# Altium footprint library Team Starcraft.PcbLib: 62 footprints (part 1 of 4)
Each footprint in its own frame and in the unit in brackets; x right, y up, seen from the top. Pads: shape width x height; smd on the part's side, far side on the other; paste and mask are expansions set on the pad; w line width, h text height; cw(c..) or ccw(c..) is an arc to the next point about the centre after c.
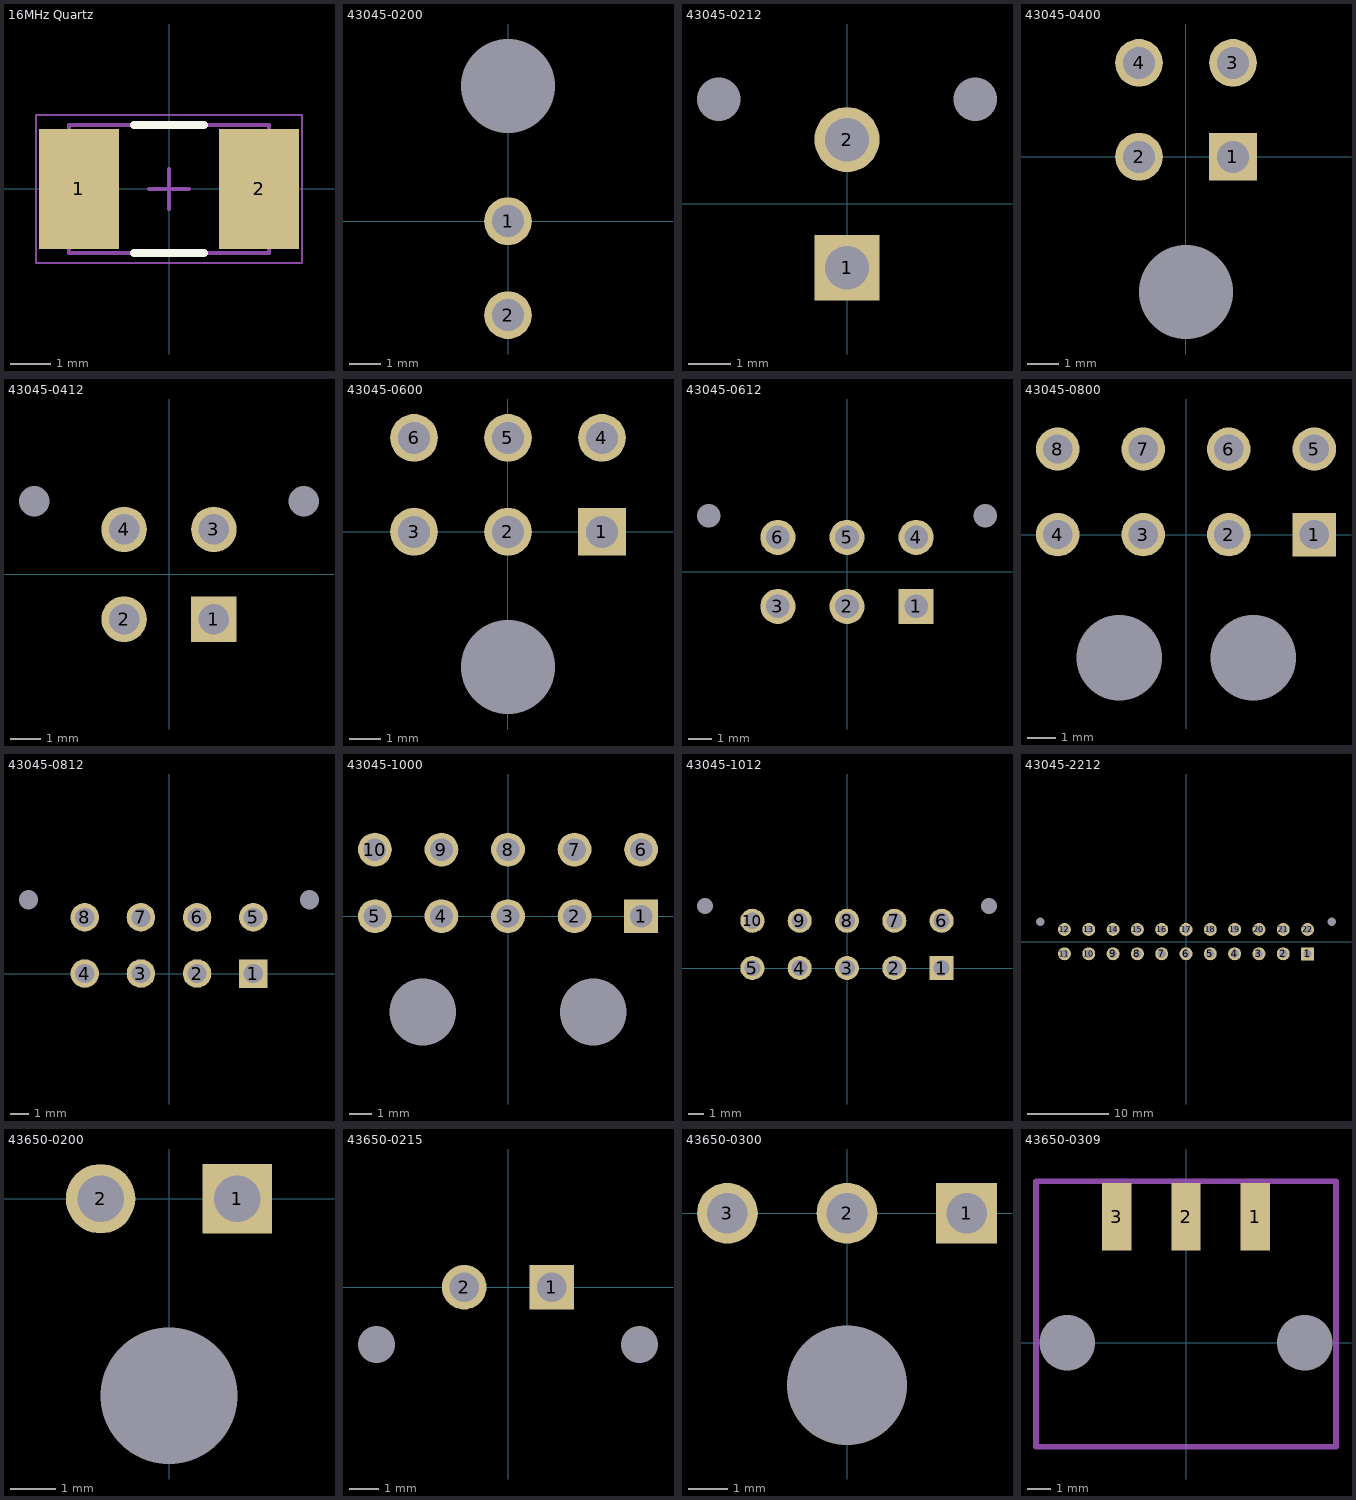
[diagram p0: the footprints below, top view; thin cyan lines are the x and y axes]

## 16MHz Quartz [mm] "16 MHz Quartz, 5x3.2 mm, Custom HC49-SMD Package"
height 1.8
pads (2):
  rect 2x3 smd: 1(-2.25,0) 2(2.25,0)
Top Overlay:
  lines w0.2: -0.875,-1.6 0.875,-1.6 ; -0.875,1.6 0.875,1.6
Mechanical 13:
  lines w0.1: -2.5,-1.6 -2.5,1.6 2.5,1.6 2.5,-1.6 -2.5,-1.6
Mechanical 15:
  lines w0.05: -3.325,-1.85 -3.325,1.85 3.325,1.85 3.325,-1.85 -3.325,-1.85
  lines w0.1: -0.5,0 0.5,0 ; 0,-0.5 0,0.5
3D body "16MHz Quartz.step": height 1.8, standoff 0, extent -2.72,-1.6 2.72,1.6

## 43045-0200 [mm] "Molex Micro-fit 3.0 Dual Row 2 Circuit, right angle, header"
pads (3):
  round 1.524 hole 1.02: 1(0,0) 2(0,-3)
  round 0 hole 3 unplated: ""(0,4.32)
3D body "43045-0200-dualrow-2circuits.stp": height 8.77, standoff -3.18, extent -3.55,-3.328 3.6,8.912

## 43045-0212 [mm]
height 9.91
pads (4):
  rect 1.524x1.524 hole 1.02: 1(0,-1.5)
  round 1.524 hole 1.02: 2(0,1.5)
  round 0 hole 1.02 unplated: ""(-3,2.44) ""(3,2.44)
3D body "430450212.stp": height 9.95, standoff -3.14, extent -3.575,-3.946 3.575,4.824

## 43045-0400 [mm] "Micro-Fit 3.0 Right Angle Header, 3.00mm Pitch, Dual Row, 4 Circuits"
height 8.77
pads (5):
  rect 1.524x1.524 hole 1.02: 1(1.5,0)
  round 1.524 hole 1.02: 2(-1.5,0) 3(1.5,3) 4(-1.5,3)
  round 0 hole 3 unplated: ""(0,-4.32)
3D body "430450400.stp": height 8.83, standoff -3.12, extent -5.075,-8.95 5.075,3.29

## 43045-0412 [mm]
height 9.91
pads (6):
  rect 1.524x1.524 hole 1.02: 1(1.5,-1.5)
  round 1.524 hole 1.02: 2(-1.5,-1.5) 3(1.5,1.5) 4(-1.5,1.5)
  round 0 hole 1.02 unplated: ""(-4.5,2.44) ""(4.5,2.44)
3D body "430450412.stp": height 9.95, standoff -3.14, extent -5.075,-3.946 5.075,4.824

## 43045-0600 [mm] "Micro-Fit 3.0 Right Angle Header, 3.00mm Pitch, Dual Row, 6 Circuits"
height 8.77
pads (7):
  rect 1.524x1.524 hole 1.02: 1(3,0)
  round 1.524 hole 1.02: 2(0,0) 3(-3,0) 4(3,3) 5(0,3) 6(-3,3)
  round 0 hole 3 unplated: ""(0,-4.32)
3D body "430450600.stp": height 8.83, standoff -3.12, extent -6.575,-8.95 6.575,3.29

## 43045-0612 [mm]
height 9.91
pads (8):
  rect 1.524x1.524 hole 1.02: 1(3,-1.5)
  round 1.524 hole 1.02: 2(0,-1.5) 3(-3,-1.5) 4(3,1.5) 5(0,1.5) 6(-3,1.5)
  round 0 hole 1.02 unplated: ""(-6,2.44) ""(6,2.44)
3D body "430450612.stp": height 9.95, standoff -3.14, extent -6.604,-3.954 6.546,4.816

## 43045-0800 [mm] "Micro-Fit 3.0 Right Angle Header, 3.00mm Pitch, Dual Row, 8 Circuits"
height 8.77
pads (10):
  rect 1.524x1.524 hole 1.02: 1(4.5,0)
  round 1.524 hole 1.02: 2(1.5,0) 3(-1.5,0) 4(-4.5,0) 5(4.5,3) 6(1.5,3) 7(-1.5,3) 8(-4.5,3)
  round 0 hole 3 unplated: ""(-2.34,-4.32) ""(2.36,-4.32)
3D body "430450800.stp": height 8.83, standoff -3.12, extent -8.075,-8.95 8.075,3.29

## 43045-0812 [mm]
height 9.91
pads (10):
  rect 1.524x1.524 hole 1.02: 1(4.5,0)
  round 1.524 hole 1.02: 2(1.5,0) 3(-1.5,0) 4(-4.5,0) 5(4.5,3) 6(1.5,3) 7(-1.5,3) 8(-4.5,3)
  round 0 hole 1.02 unplated: ""(-7.5,3.94) ""(7.5,3.94)
3D body "430450812.stp": height 9.95, standoff -3.14, extent -8.075,-2.446 8.075,6.324

## 43045-1000 [mm] "Micro-Fit 3.0 Right Angle Header, 3.00mm Pitch, Dual Row, 10 Circuits"
height 8.77
pads (12):
  rect 1.524x1.524 hole 1.02: 1(6,0)
  round 1.524 hole 1.02: 2(3,0) 3(0,0) 4(-3,0) 5(-6,0) 6(6,3) 7(3,3) 8(0,3) 9(-3,3) 10(-6,3)
  round 0 hole 3 unplated: ""(-3.85,-4.32) ""(3.85,-4.32)
3D body "430451000.stp": height 8.83, standoff -3.12, extent -9.575,-8.95 9.575,3.29

## 43045-1012 [mm]
height 9.91
pads (12):
  rect 1.524x1.524 hole 1.02: 1(6,0)
  round 1.524 hole 1.02: 2(3,0) 3(0,0) 4(-3,0) 5(-6,0) 6(6,3) 7(3,3) 8(0,3) 9(-3,3) 10(-6,3)
  round 0 hole 1.02 unplated: ""(-9,3.94) ""(9,3.94)
3D body "430451012.stp": height 9.95, standoff -3.14, extent -9.575,-2.446 9.575,6.324

## 43045-2212 [mm]
height 9.91
pads (24):
  rect 1.6x1.6 hole 1.02: 1(15,-1.5)
  round 1.6 hole 1.02: 2(12,-1.5) 3(9,-1.5) 4(6,-1.5) 5(3,-1.5) 6(0,-1.5) 7(-3,-1.5) 8(-6,-1.5) 9(-9,-1.5) 10(-12,-1.5) 11(-15,-1.5) 12(-15,1.5) 13(-12,1.5) 14(-9,1.5) 15(-6,1.5) 16(-3,1.5) 17(0,1.5) 18(3,1.5) 19(6,1.5) 20(9,1.5) 21(12,1.5) 22(15,1.5)
  round 0 hole 1.02 unplated: ""(-18,2.44) ""(18,2.44)
3D body "430452212.stp": height 9.95, standoff -3.14, extent -18.575,-3.946 18.575,4.824

## 43650-0200 [mm] "Micro-Fit 3.0 Right Angle Header, 3.00mm Pitch, Single Row, 2 Circuits"
height 8.77
pads (3):
  rect 1.524x1.524 hole 1.02: 1(1.5,0)
  round 1.524 hole 1.02: 2(-1.5,0)
  round 0 hole 3 unplated: ""(0,-4.32)
3D body "436500200.stp": height 5.64, standoff -3.27, extent -4.825,-8.9 4.825,1

## 43650-0215 [mm] "Micro-Fit 3.0 Vertical Header, 3.00mm Pitch, Single Row, 2 Circuits"
height 9.9
pads (4):
  rect 1.524x1.524 hole 1.02: 1(1.5,0)
  round 1.524 hole 1.02: 2(-1.5,0)
  round 0 hole 1.27 unplated: ""(-4.5,-1.96) ""(4.5,-1.96)
3D body "436500215.stp": height 9.95, standoff -3.13, extent -4.825,-2.47 4.825,3.135

## 43650-0300 [mm] "Micro-Fit 3.0 Right Angle Header, 3.00mm Pitch, Single Row, 3 Circuits"
height 8.77
pads (4):
  rect 1.524x1.524 hole 1.02: 1(3,0)
  round 1.524 hole 1.02: 2(0,0) 3(-3,0)
  round 0 hole 3 unplated: ""(0,-4.32)
3D body "436500300.stp": height 5.64, standoff -3.27, extent -6.325,-8.9 6.325,1

## 43650-0309 [mm] "Micro-Fit 3.0 Right-Angle Header, 3.00mm Pitch, Single Row, 3 Circuits, with PCB Press-fit Metal Retention Clip, Tin, Glow-Wire Capable, Black"
height 5.57
pads (5):
  rect 1.27x2.92 smd: 1(3,5.47) 2(0,5.47) 3(-3,5.47)
  round 0 hole 2.41: ""(-5.15,0) ""(5.15,0)
Mechanical 1:
  lines w0.254: -6.5,-4.5 6.5,-4.5 6.5,7 -6.5,7 -6.5,-4.5
3D body "436500309.stp": height 5.64, standoff -1.97, extent -6.325,-4.596 6.325,6.144